# Altium footprint library 显示器件封装库.PcbLib: 45 footprints (part 2 of 3)
Each footprint in its own frame and in the unit in brackets; x right, y up, seen from the top. Pads: shape width x height; smd on the part's side, far side on the other; paste and mask are expansions set on the pad; w line width, h text height; cw(c..) or ccw(c..) is an arc to the next point about the centre after c.
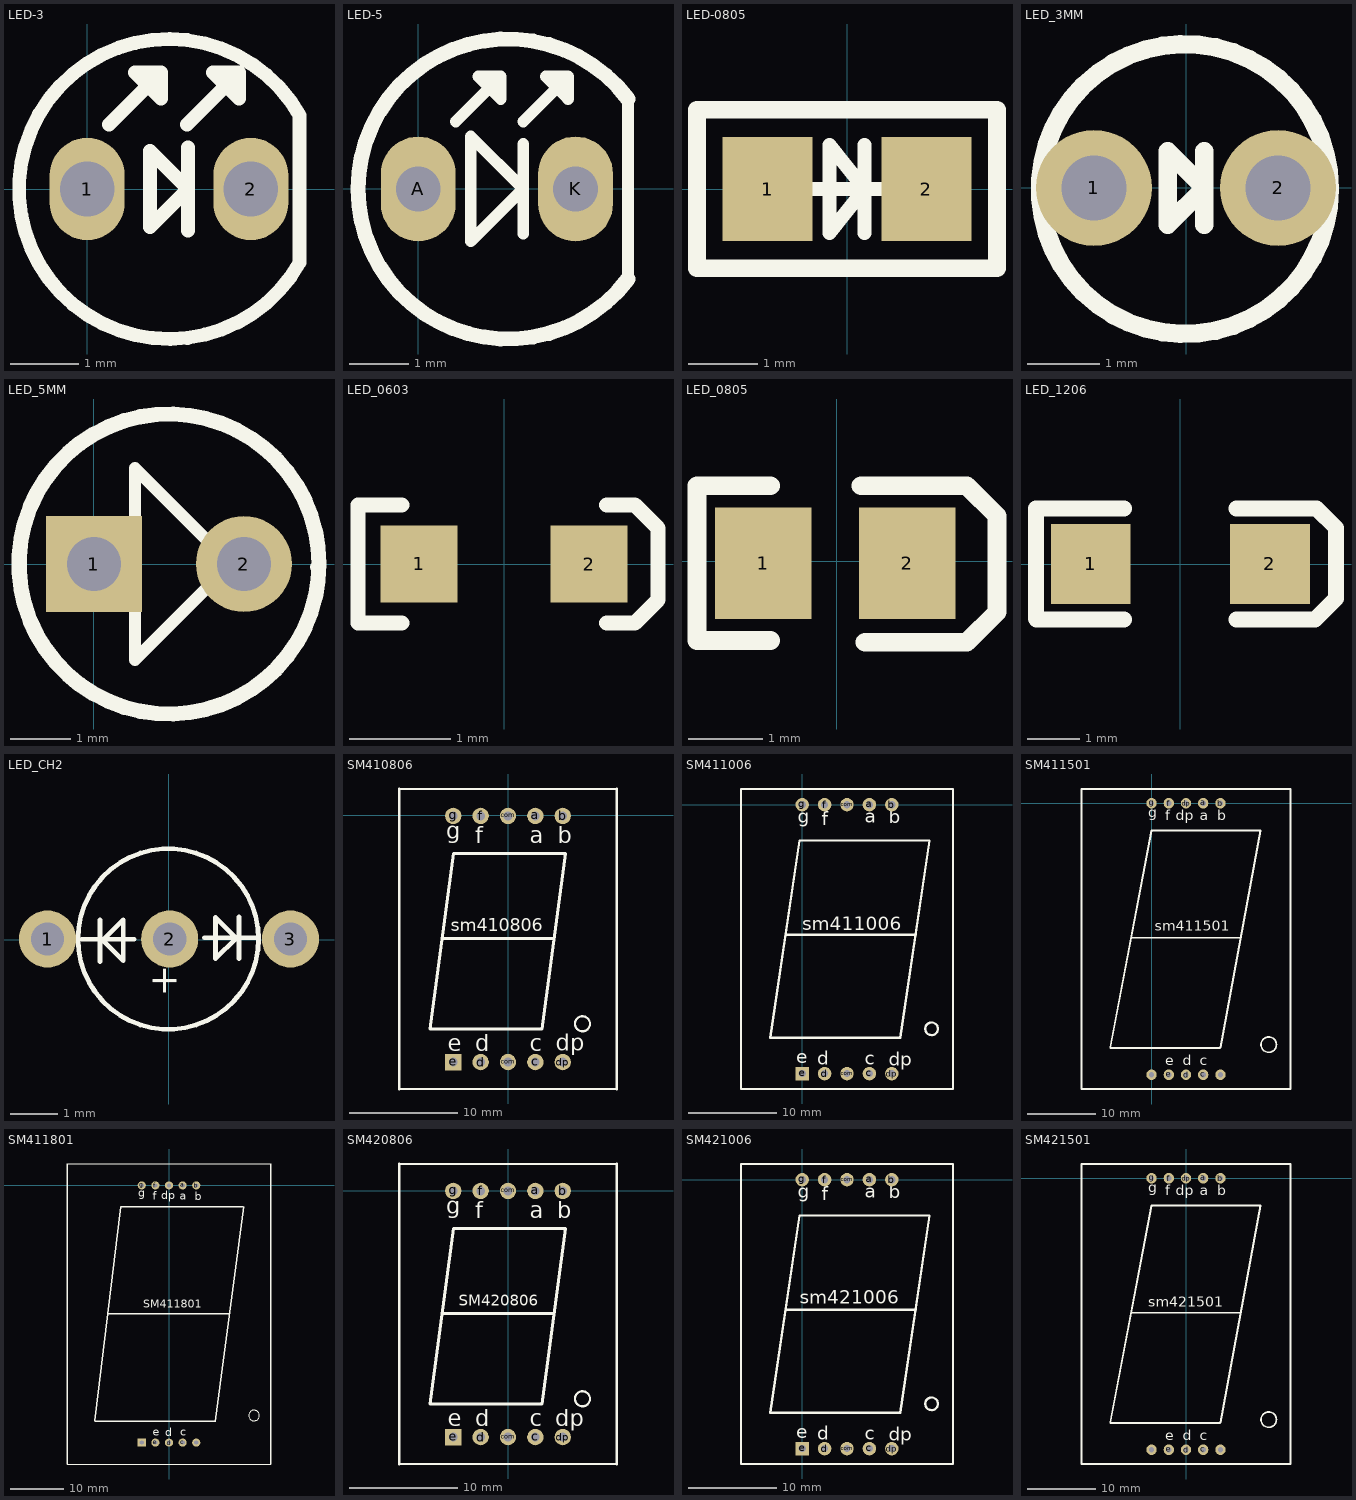
[diagram p1: the footprints below, top view; thin cyan lines are the x and y axes]

## LED-3 [mm]
pads (2):
  oval 1.1x1.5 hole 0.8: 1(0,0) 2(2.4,0)
Top Overlay:
  lines w0.203: 0.322,0.946 1.084,1.708 ; 1.465,0.946 2.227,1.708 ; 1.479,-0.61 1.479,0.61 ; 3.116,-1.073 3.116,1.082 ccw(c1.2,0) 3.119,-1.076 ; 1.084,1.708 0.703,1.708 1.084,1.327 1.084,1.708 ; 2.227,1.708 2.227,1.327 1.846,1.708 2.227,1.708 ; 0.921,-0.559 1.479,0 0.921,0.559 0.921,-0.559

## LED-5 [mil]
pads (2):
  oval 50x70 hole 30: A(0,0) K(105,0)
Top Overlay:
  lines w7.78: 25,45 55,75 ; 70,-30 70,30 ; 70,45 100,75 ; 140,-60.15 140,60 ; 55,75 55,60 40,75 55,75 ; 100,75 100,60 85,75 100,75 ; 35,-35 35,35 70,0 35,-35
  lines w10: 140,-60.15 cw(c59.9,-0.07) 140,60

## LED-0805 [mm]
pads (2):
  rect 1.3x1.5 smd: 1(-1.143,0) 2(1.143,0)
Top Overlay:
  lines w0.203: -0.508,0 0.508,0 ; 0.254,-0.635 0.254,0.635 ; -0.254,-0.635 -0.254,0.635 0.254,0 -0.254,-0.635
  lines w0.254: -2.159,-1.143 -2.159,1.143 2.159,1.143 2.159,-1.143 -2.159,-1.143
3D body: height 0.85, standoff 0.01, extent -1.042,-0.453 1.021,0.453

## LED_3MM [mm]
height 1.99
pads (2):
  round 1.6 hole 0.9: 1(-1.27,0) 2(1.27,0)
Top Overlay:
  circle w0.254: c-0.015,-0.015 r2
  lines w0.2: 0.63,0 0.79,0
  lines w0.254: 0.254,-0.508 0.254,0 ; 0.254,0.508 0.254,0 ; 0.254,0 -0.254,0.508 -0.254,-0.508 0.254,0
3D body: height 5.2, standoff -3, extent -1.96,-1.993 1.524,1.993

## LED_5MM [mm]
height 1.99
pads (2):
  rect 1.6x1.6 hole 0.9: 1(0,0)
  round 1.6 hole 0.9: 2(2.5,0)
Top Overlay:
  circle w0.254: c1.25,0 r2.5
  lines w0.2: 3.7,-0.05 3.75,0 ; 0.68,-1.6 2.28,0 0.68,1.6 0.68,-1.6
3D body: height 9.5, standoff -4, extent -1.476,-3 4.024,3

## LED_0603 [mil]
pads (2):
  rect 30x30 smd: 1(-33.16,0.03) 2(33.16,-0.03)
Top Overlay:
  lines w6: -40,-23 -57,-23 -57,23 -40,23 ; 40,-23 51,-23 60,-14 60,14 51,23 40,23
3D body: height 17.72, standoff 0, extent -31.89,-15.35 31.1,16.14

## LED_0805 [mm]
pads (2):
  rect 1.3x1.5 smd: 1(-0.991,-0.025) 2(0.95,-0.025)
Top Overlay:
  lines w0.254: -0.889,-1.067 -1.88,-1.067 -1.88,1.016 -0.889,1.016 ; 0.33,1.016 1.753,1.016 2.159,0.61 2.159,-0.686 1.753,-1.092 0.381,-1.092
3D body: height 1.1, standoff 0, extent -0.98,-0.655 1.04,0.595

## LED_1206 [mil]
pads (2):
  rect 60x60 smd: 1(-67.5,0) 2(67.5,0)
Top Overlay:
  lines w12: -108.76,-40.94 -108.76,41.73 -42.5,41.73 ; -108.37,-41.73 -42.62,-41.73 ; 42.42,-41.73 101.48,-41.73 116.04,-27.17 117.22,-25.98 117.22,27.17 102.66,41.73 101.87,41.73 42.42,41.73
3D body: height 43.81, standoff -15.9, extent -64.18,-31.89 61.82,31.11

## LED_CH2 [mm]
pads (3):
  round 1.2 hole 0.7: 1(-2.555,0.015) 2(0.015,0.015) 3(2.555,0.015)
Top Overlay:
  circle w0.1: c-0.015,0.015 r1.9
  lines w0.1: -1.83,0.01 -0.73,0.01 ; -1.45,-0.46 -1.45,0.42 ; 0.74,0.04 1.86,0.04 ; 1.47,-0.395 1.47,0.485 ; -1.39,-0.01 -0.96,-0.44 -0.96,0.42 -1.39,-0.01 ; 0.98,-0.395 1.41,0.035 0.98,0.465 0.98,-0.395
  text "+" at 0.365,-1.195 h1

## SM410806 [mil]
pads (10):
  round 60 hole 32: a(100,-3) b(200,-3) c(100,-903) com(0,-903) com(0,-3) d(-100,-903) dp(200,-903) f(-100,-3) g(-200,-3)
  rect 60x60 hole 32: e(-200,-903)
Top Overlay:
  circle w8: c272.44,-763 r27.56
  lines w8: -397.64,-1001.42 397.64,-1001.42 ; -397.64,95.42 397.64,95.42 ; -242.2,-447.37 -238.26,-451.31 ; 167.25,-451.31 171.19,-447.37
  lines w10: -397.64,-1001.42 -397.64,95.42 ; -238.26,-451.31 167.25,-451.31 ; 397.64,-1001.42 397.64,95.42 ; -285.5,-782.02 -198.89,-140.28 210.56,-140.28 123.94,-782.02 -285.5,-782.02
  text "d" at -120,-863 h60
  text "c" at 80,-863 h60
  text "dp" at 174,-861 h60
  text "e" at -220,-863 h60
  text "b" at 181,-103 h60
  text "a" at 80,-103 h60
  text "f" at -120,-103 h60
  text "g" at -225.87,-86.3 h60
  text "sm410806" at -210,-425 h47.24

## SM411006 [mil]
pads (10):
  round 60 hole 32: a(299.87,-0.44) b(399.87,-0.44) c(299.87,-1200.52) com(199.87,-1200.52) com(199.87,-0.44) d(99.87,-1200.52) dp(399.87,-1200.52) f(99.87,-0.44) g(-0.13,-0.44)
  rect 60x60 hole 32: e(-0.13,-1200.52)
Top Overlay:
  circle w10: c577.43,-1000.52 r28.28
  lines w10: -72.57,-580.52 507.43,-580.52 ; 199.87,69.48 -272.57,69.48 ; -272.57,69.48 672.32,69.48 ; -272.57,69.48 -272.57,-1269.1 672.32,-1269.1 ; 672.31,-1269.1 672.31,69.48 ; 672.32,-1269.1 672.32,69.48 ; -142.57,-1040.52 437.43,-1040.52 567.43,-160.52 -12.57,-160.52 -142.57,-1040.52
  text "e" at -26,-1154 h60
  text "g" at -20,-80 h60
  text "f" at 88,-92 h60
  text "a" at 280,-82 h60
  text "b" at 386,-84 h60
  text "dp" at 386,-1166 h60
  text "c" at 278,-1160 h60
  text "d" at 68,-1162 h60
  text "sm411006" at 0,-560 h60

## SM411501 [mil]
pads (10):
  round 60 hole 31.5: a(300,0) b(400,0) c(300,-1574.8) com(0,-1574.8) com(400,-1574.8) d(200,-1574.8) dp(200,0) e(100,-1574.8) f(100,0) g(0,0)
Top Overlay:
  circle w10: c680,-1400 r44.72
  lines w10: -240.07,-1417.32 0,-157.48 632.22,-157.48 400,-1417.32 ; -240,-1420 397.32,-1420 ; -112.99,-780 520,-780 ; -406.3,-1657.48 806.3,-1657.48 806.3,82.68 -406.3,82.68 -406.3,-1657.48
  text "sm411501" at 20,-740 h60
  text "b" at 380,-100 h60
  text "a" at 280,-100 h60
  text "dp" at 140,-100 h60
  text "e" at 80,-1520 h60
  text "d" at 180,-1520 h60
  text "c" at 280,-1520 h60
  text "g" at -20,-80 h60
  text "f" at 80,-100 h60

## SM411801 [mil]
pads (10):
  round 60 hole 32: a(100,0) b(200,0) c(100,-1889.76) com(200,-1889.76) d(0,-1889.76) dp(0,0) e(-100,-1889.76) f(-100,0) g(-200,0)
  rect 60x60 hole 32: com(-200,-1889.76)
Top Overlay:
  circle w8: c624.63,-1691 r39.37
  lines w8: -748.03,-2047.24 748.03,-2047.24 ; -748.03,157.48 748.03,157.48
  lines w10: -748.03,-2047.24 -748.03,157.48 ; -545,-1732.28 342.52,-1732.28 ; -545,-1728 -355.02,-157.48 544.2,-157.48 ; -451,-943 445,-943 ; 341.23,-1732.28 549,-157.48 ; 748.03,-2047.24 748.03,157.48
  text "g" at -226,-84 h60
  text "f" at -121,-105 h60
  text "a" at 78,-105 h60
  text "b" at 188,-110 h60
  text "e" at -121,-1838 h60
  text "dp" at -58,-100 h60
  text "c" at 83,-1838 h60
  text "d" at -27,-1843 h60
  text "SM411801" at -190,-900 h59.05

## SM420806 [mil]
pads (10):
  round 60 hole 32: a(100,0) b(200,0) c(100,-900) com(0,-900) com(0,0) d(-100,-900) dp(200,-900) f(-100,0) g(-200,0)
  rect 60x60 hole 32: e(-200,-900)
Top Overlay:
  circle w8: c272.44,-760 r27.56
  lines w8: -397.64,-998.42 397.64,-998.42 ; -397.64,98.42 397.64,98.42 ; -242.2,-444.37 -238.26,-448.31 ; 167.25,-448.31 171.19,-444.37
  lines w10: -397.64,-998.42 -397.64,98.42 ; -238.26,-448.31 167.25,-448.31 ; 397.64,-998.42 397.64,98.42 ; -285.5,-779.02 -198.89,-137.28 210.56,-137.28 123.94,-779.02 -285.5,-779.02
  text "d" at -120,-860 h60
  text "c" at 80,-860 h60
  text "dp" at 172,-861 h60
  text "e" at -220,-860 h60
  text "b" at 180,-100 h60
  text "a" at 80,-100 h60
  text "f" at -120,-100 h60
  text "g" at -225.87,-83.3 h60
  text "SM420806" at -180,-420 h40

## SM421006 [mil]
pads (10):
  round 60 hole 32: a(299.87,-0.44) b(399.87,-0.44) c(299.87,-1200.52) com(199.87,-1200.52) com(199.87,-0.44) d(99.87,-1200.52) dp(399.87,-1200.52) f(99.87,-0.44) g(-0.13,-0.44)
  rect 60x60 hole 32: e(-0.13,-1200.52)
Top Overlay:
  circle w10: c577.43,-1000.52 r28.28
  lines w10: -72.57,-580.52 507.43,-580.52 ; 199.87,69.48 -272.57,69.48 ; -272.57,69.48 -272.57,-1269.1 672.32,-1269.1 ; -272.57,69.48 672.32,69.48 ; 672.32,-1269.1 672.32,69.48 ; 672.31,-1269.1 672.31,69.48 ; -142.57,-1040.52 -12.57,-160.52 567.43,-160.52 437.43,-1040.52 -142.57,-1040.52
  text "sm421006" at -10,-555 h60
  text "d" at 68,-1162 h60
  text "c" at 278,-1160 h60
  text "dp" at 386,-1166 h60
  text "b" at 386,-84 h60
  text "a" at 280,-82 h60
  text "f" at 88,-92 h60
  text "g" at -20,-80 h60
  text "e" at -26,-1154 h60

## SM421501 [mil]
pads (10):
  round 60 hole 31.5: a(100,0) b(200,0) c(100,-1574.8) com(-200,-1574.8) com(200,-1574.8) d(0,-1574.8) dp(0,0) e(-100,-1574.8) f(-100,0) g(-200,0)
Top Overlay:
  circle w10: c480,-1400 r44.72
  lines w10: -440.07,-1417.32 -200,-157.48 432.22,-157.48 200,-1417.32 ; -440,-1420 197.32,-1420 ; -312.99,-780 320,-780 ; -606.3,-1657.48 -606.3,82.68 606.3,82.68 606.3,-1657.48 -606.3,-1657.48
  text "sm421501" at -220,-745 h60
  text "f" at -120,-100 h60
  text "g" at -220,-80 h60
  text "c" at 80,-1520 h60
  text "d" at -20,-1520 h60
  text "e" at -120,-1520 h60
  text "dp" at -60,-100 h60
  text "a" at 80,-100 h60
  text "b" at 180,-100 h60